# Altium footprint library mmyLibrary.PcbLib: 231 footprints (part 4 of 15)
Each footprint in its own frame and in the unit in brackets; x right, y up, seen from the top. Pads: shape width x height; smd on the part's side, far side on the other; paste and mask are expansions set on the pad; w line width, h text height; cw(c..) or ccw(c..) is an arc to the next point about the centre after c.
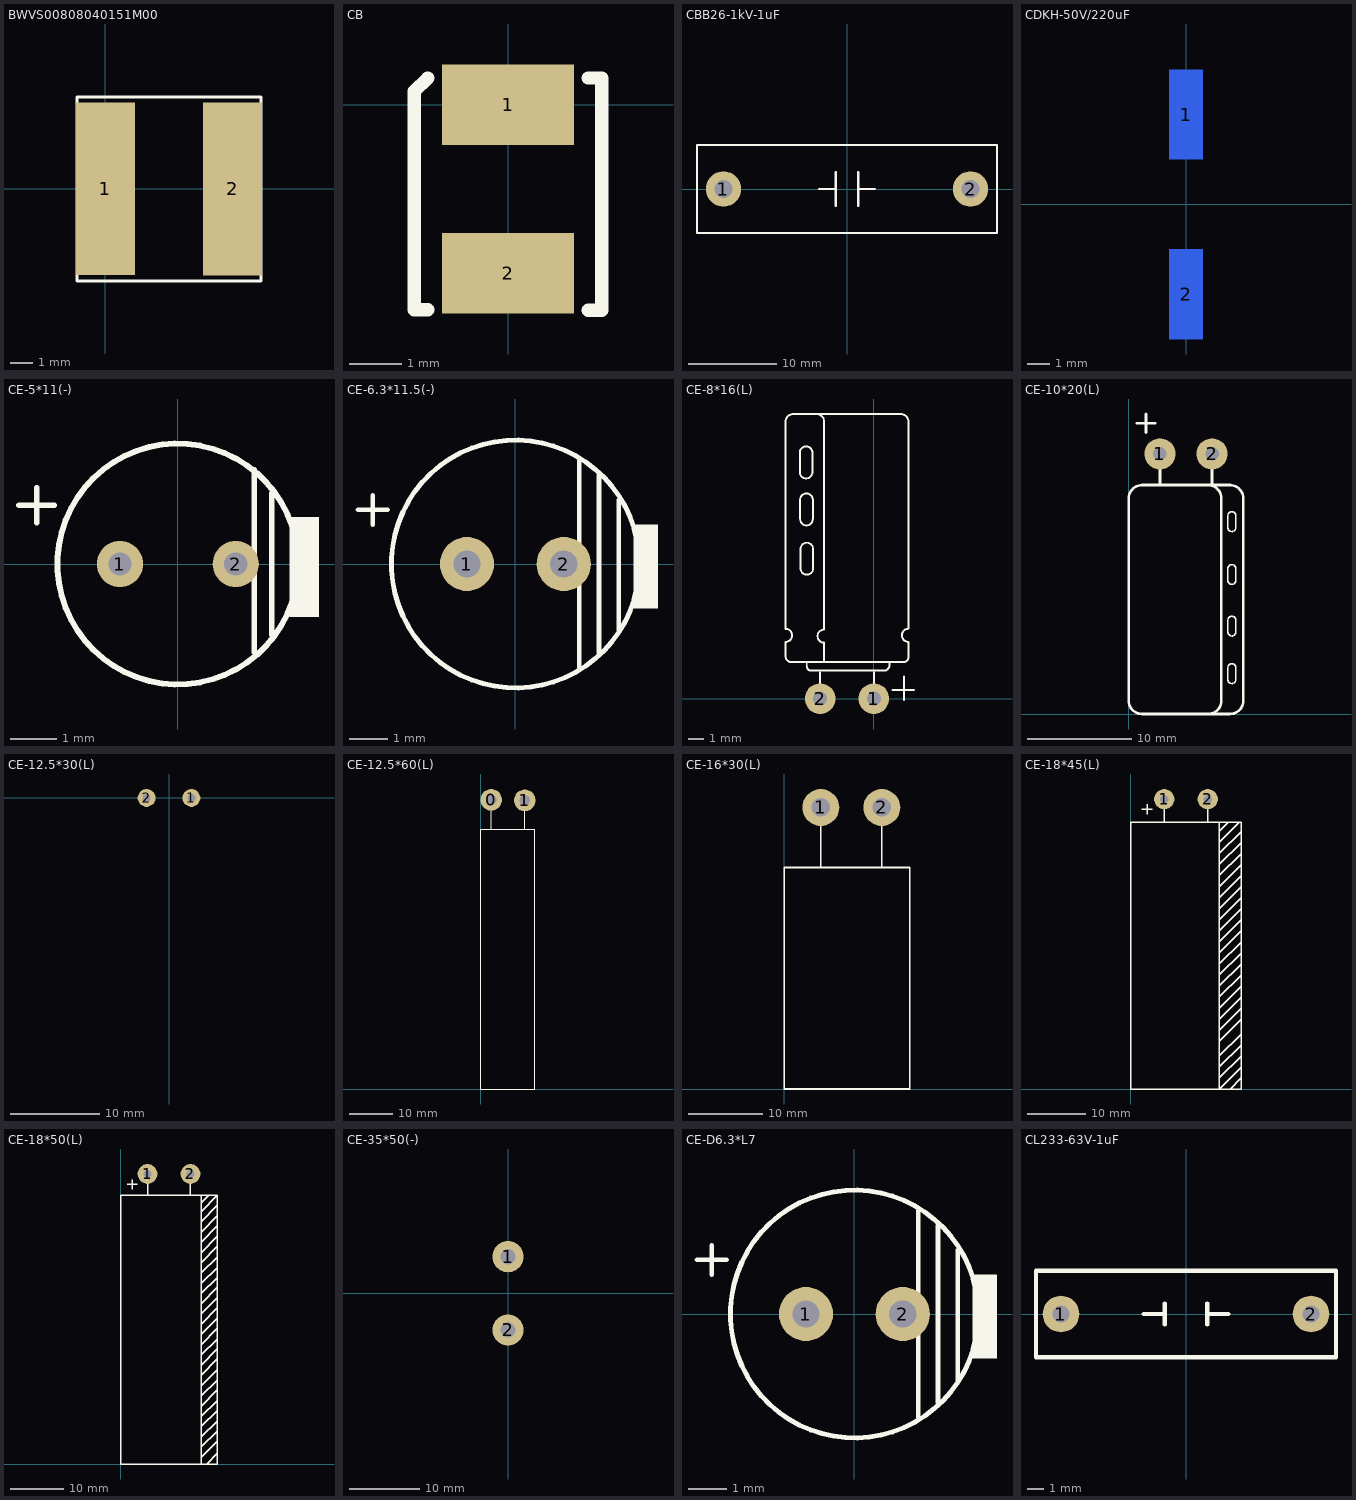
[diagram p3: the footprints below, top view; thin cyan lines are the x and y axes]

## BWVS00808040151M00 [mm] "8mm*8mm*4mm"
height 4
pads (2):
  rect 2.6x7.6 smd: 1(0,0) 2(5.608,-0.014)
Top Overlay:
  lines w0.127: -1.25,-4.064 6.85,-4.064 6.85,4.036 -1.25,4.036 -1.25,-4.064

## CB [mm]
pads (2):
  rect 2.5x1.524 smd: 1(0,0) 2(0,-3.2)
Top Overlay:
  lines w0.254: -1.524,-3.891 -1.778,-3.891 -1.778,0.254 -1.524,0.508 ; 1.524,-3.905 1.778,-3.905 1.778,0.508 1.524,0.508
3D body "User Library-TAN1206.STEP": height 1.6, standoff 0, extent -0.673,-3.124 0.927,0.076

## CBB26-1kV-1uF [mm]
pads (2):
  round 4 hole 2: 1(-14,0) 2(14,0)
Top Overlay:
  lines w0.254: -3.175,0 -1.27,0 ; -1.27,-1.905 -1.27,1.905 ; 1.27,-1.905 1.27,1.905 ; 1.27,0 3.175,0 ; -17,-5 -17,5 17,5 17,-5 -17,-5

## CDKH-50V/220uF [mm]
pads (2):
  rect 1.5x4 smd far side: 1(0,4) 2(0,-4)
Bottom Overlay:
  lines w0.127: -1,-1 1,-1 ; -1,1 1,1 ; -0.508,6.858 0.508,6.858 ; 0,6.35 0,7.366 ; 1,-2 5.5,-2 ; 1,2 5.5,2 ; 4.025,5.461 5.461,4.025 ; -5.5,4.064 -4.064,5.5 ; -5.5,4.064 -4.064,5.5 ; -5.5,4.064 -5.5,-5.5 -1,-5.5 -1,5.5 -4.064,5.5 ; 1,-5.5 1,5.5 3.986,5.5 5.5,3.986 5.5,-5.5 1,-5.5

## CE-5*11(-) [mm]
pads (2):
  round 1 hole 0.5: 1(-1.25,0) 2(1.25,0)
Top Overlay:
  circle w0.127: c0,0 r2.6
  rectangle: 2.413,-1.143 3.048,1.016
  lines w0.12: -3.429,1.27 -2.667,1.27 ; -3.048,0.889 -3.048,1.651 ; 1.651,-1.905 1.651,2.032 ; 2.032,-1.524 2.032,1.524
3D body "User Library-CAPPD5x11.STEP": height 11.47, standoff -1.26, extent -2.603,-2.642 2.603,2.54

## CE-6.3*11.5(-) [mm]
pads (2):
  round 1.4 hole 0.7: 1(-1.25,0) 2(1.25,0)
Top Overlay:
  circle w0.127: c0,0 r3.2
  rectangle: 3.048,-1.143 3.683,1.016
  lines w0.12: -4.064,1.397 -3.302,1.397 ; -3.683,1.016 -3.683,1.778 ; 1.651,-2.667 1.651,2.667 ; 2.159,-2.286 2.159,2.286 ; 2.667,-1.778 2.667,1.651
3D body "User Library-CAPAER_D063_L115_P025_W005X030.STEP": height 11.51, standoff -3, extent -3.16,-3.15 3.15,3.15

## CE-8*16(L) [mm]
pads (2):
  round 2 hole 0.9: 1(0,0) 2(-3.5,0)
Top Overlay:
  lines w0.127: -5.75,12.27 -5.75,18.034 cw(c-5.25,18.034) -5.25,18.534 -3.74,18.534 ; -5.75,12.5 -5.75,4.546 cw(c-5.75,4.118) -5.75,3.69 -5.75,2.77 ccw(c-5.36,2.77) -5.36,2.38 1.61,2.38 1.94,2.38 ccw(c1.94,2.69) 2.25,2.69 2.25,3.694 cw(c2.25,4.122) 2.25,4.55 2.25,12.5 ; -4.82,16.01 cw(c-4.409,16.01) -3.998,16.01 ; -4.82,16.029 -4.82,14.75 ccw(c-4.409,14.75) -3.998,14.75 -3.998,16.029 ; -4.8,12.95 cw(c-4.389,12.95) -3.978,12.95 ; -4.8,12.969 -4.8,11.69 ccw(c-4.389,11.69) -3.978,11.69 -3.978,12.969 ; -4.78,9.74 cw(c-4.369,9.74) -3.958,9.74 ; -4.78,9.759 -4.78,8.48 ccw(c-4.369,8.48) -3.958,8.48 -3.958,9.759 ; -4.37,2.38 -4.37,2.1 ccw(c-4.09,2.1) -4.09,1.82 -0.68,1.82 ; -3.5,0 -3.5,1.7 ; -3.5,1.82 -0.04,1.82 ; -3.24,2.39 -3.24,2.93 ; -3.24,2.82 -3.24,3.6 ; -3.24,3.642 cw(c-3.24,4.07) -3.24,4.498 -3.24,4.99 ; -3.24,4.89 -3.24,11.88 -3.24,12.24 ; -3.24,12.25 -3.24,18.034 ccw(c-3.74,18.034) -3.74,18.534 ; -3.24,17.145 -3.24,17.23 ; -0.26,1.82 0.66,1.82 ; 0,0 0,1.69 ; 0.67,1.83 ccw(c0.67,2.17) 1.01,2.17 1.01,2.39 ; 1.21,0.57 2.61,0.57 ; 1.95,-0.09 1.95,1.45 ; 2.25,12.27 2.25,17.435 ; 2.25,17.145 2.25,18.034 ccw(c1.75,18.034) 1.75,18.534 -3.74,18.534

## CE-10*20(L) [mm]
pads (2):
  round 3 hole 1.3: 1(3,25) 2(8,25)
Top Overlay:
  lines w0.127: 9.525,3.302 ccw(c9.906,3.302) 10.287,3.302 10.287,4.445 ccw(c9.906,4.445) 9.525,4.445 9.525,3.302 ; 9.525,7.874 ccw(c9.906,7.874) 10.287,7.874 10.287,9.017 ccw(c9.906,9.017) 9.525,9.017 9.525,7.874 ; 9.525,12.827 ccw(c9.906,12.827) 10.287,12.827 10.287,13.97 ccw(c9.906,13.97) 9.525,13.97 9.525,12.827 ; 9.525,17.907 ccw(c9.906,17.907) 10.287,17.907 10.287,19.05 ccw(c9.906,19.05) 9.525,19.05 9.525,17.907
  lines w0.254: 0,18.415 0,20.73 cw(c1.27,20.73) 1.27,22 9.75,22 ; 0,20.574 0,1.27 ccw(c1.27,1.27) 1.27,0 ; 0.762,27.94 2.54,27.94 ; 1.651,27.051 1.651,28.829 ; 2.794,0 1.27,0 ; 3,22 3,25 ; 6.604,22 7.62,22 cw(c7.62,20.73) 8.89,20.73 8.89,1.27 cw(c7.62,1.27) 7.62,0 ; 8,22 8,25 ; 8.509,0 9.73,0 ccw(c9.73,1.27) 11,1.27 ; 8.763,22 9.73,22 cw(c9.73,20.73) 11,20.73 ; 9.652,0 1.27,0 ; 11,1.348 11,20.75

## CE-12.5*30(L) [mm]
height 30
pads (2):
  round 2 hole 0.9: 1(2.5,0) 2(-2.5,0)
Bottom Overlay:
  lines w0.127: -6.511,-31.642 ccw(c-5.551,-31.552) -5.461,-32.512 ; -6.5,-31.8 -6.5,-5.78 ; -6.5,-5.7 cw(c-6.26,-5.75) -6.21,-5.51 ; -6.5,-2.9 cw(c-6.085,-2.915) -6.07,-2.5 ; -6.5,-2.86 -6.5,-3.62 ccw(c-6.26,-3.67) -6.31,-3.91 cw(c-6.31,-4.71) -6.31,-5.51 ; -5.99,-2.5 5.76,-2.5 ; -5.46,-32.5 5.63,-32.5 ; -4.109,-27.129 ccw(c-5.059,-27.183) -6.01,-27.174 -6.01,-30.534 ccw(c-5.06,-30.48) -4.109,-30.489 -4.109,-27.109 ; -3.99,-2.5 cw(c-3.255,-2.455) -3.3,-1.72 ; -3.979,-17.979 ccw(c-4.929,-18.033) -5.88,-18.024 -5.88,-21.384 ccw(c-4.93,-21.33) -3.979,-21.339 -3.979,-17.959 ; -3.979,-9.339 ccw(c-4.929,-9.393) -5.88,-9.384 -5.88,-12.744 ccw(c-4.93,-12.69) -3.979,-12.699 -3.979,-9.319 ; -3.336,-31.642 ccw(c-2.376,-31.552) -2.286,-32.512 ; -3.29,-1.72 3.28,-1.72 cw(c3.16,-2.38) 3.82,-2.5 ; -3.28,-31.8 -3.28,-5.77 ; -3.28,-5.69 cw(c-3.04,-5.74) -2.99,-5.5 ; -3.28,-2.49 -3.28,-3.61 ccw(c-3.04,-3.66) -3.09,-3.9 cw(c-3.09,-4.7) -3.09,-5.5 ; -2.5,-1.7 -2.5,0 ; 2.5,-1.69 2.5,0 ; 3.71,-0.57 5.11,-0.57 ; 4.45,-1.45 4.45,0.09 ; 5.588,-32.512 ccw(c5.498,-31.552) 6.458,-31.462 ; 5.65,-2.5 6.1,-2.5 cw(c6.085,-2.915) 6.5,-2.93 6.5,-3.62 cw(c6.26,-3.67) 6.31,-3.91 ccw(c6.31,-4.71) 6.31,-5.51 ; 6.21,-5.51 cw(c6.26,-5.75) 6.5,-5.7 6.5,-31.8

## CE-12.5*60(L) [mm]
pads (2):
  round 5 hole 2.5: 0(2.413,66.802) 1(10.16,66.675)
Top Overlay:
  lines w0.254: 2.413,60 2.413,66.802 ; 10.16,60 10.16,66.675 ; 0,0 12.5,0 12.5,60 0,60 0,0

## CE-16*30(L) [mm]
pads (2):
  round 5 hole 2.5: 1(4.953,38.1) 2(13.208,38.1)
Top Overlay:
  lines w0.254: 4.953,30 4.953,38.1 ; 13.208,30.127 13.208,38.1 ; 0,0 0,30 17,30 17,0 0,0

## CE-18*45(L) [mm]
pads (2):
  round 3.5 hole 1.5: 1(5.75,50) 2(13.25,50)
Top Overlay:
  lines w0.254: 1.905,48.26 3.683,48.26 ; 2.794,47.371 2.794,49.149 ; 5.75,46 5.75,50 ; 13.25,46 13.25,50 ; 15.24,1.905 19,5.665 ; 15.24,3.81 19,7.57 ; 15.24,5.715 19,9.475 ; 15.24,8.255 19,12.015 ; 15.24,10.16 19,13.92 ; 15.24,12.065 19,15.825 ; 15.24,13.97 19,17.73 ; 15.24,15.875 19,19.635 ; 15.24,17.78 19,21.54 ; 15.24,19.685 19,23.445 ; 15.24,21.59 19,25.35 ; 15.24,23.495 19,27.255 ; 15.24,25.4 19,29.16 ; 15.24,27.305 19,31.065 ; 15.24,29.21 19,32.97 ; 15.24,31.115 19,34.875 ; 15.24,33.02 19,36.78 ; 15.24,34.925 19,38.685 ; 15.24,36.83 19,40.59 ; 15.24,38.735 19,42.495 ; 15.24,40.64 19,44.4 ; 15.24,42.545 18.695,46 ; 15.24,44.45 16.764,45.974 ; 15.24,46 15.24,0 19,3.76 ; 17.145,0 18.962,1.817 ; 0,0 19,0 19,46 0,46 0,0

## CE-18*50(L) [mm]
pads (2):
  round 3.7 hole 1.5: 1(5,54) 2(13,54)
Top Overlay:
  lines w0.254: 1.27,52.07 3.048,52.07 ; 2.159,51.181 2.159,52.959 ; 5,50 5,55 ; 13,50 13,55 ; 15,0 15,50 ; 15,1.27 18,4.191 ; 15,3.175 18,6.096 ; 15,5.08 18,8.001 ; 15,6.985 18,9.906 ; 15,8.89 18,11.811 ; 15,10.795 18,13.843 ; 15,12.7 18,15.621 ; 15,14.605 18,17.526 ; 15,16.51 18,19.558 ; 15,18.415 18,21.463 ; 15,20.32 18,23.241 ; 15,22.225 18,25.273 ; 15,24.13 18,27.178 ; 15,26.035 18,29.083 ; 15,27.94 18,30.988 ; 15,29.845 18,32.893 ; 15,31.75 18,34.671 ; 15,33.655 18,36.576 ; 15,35.56 18,38.481 ; 15,37.465 18,40.513 ; 15,39.37 18,42.418 ; 15,41.275 18,44.323 ; 15,43.18 18,46.228 ; 15,45.085 18,48.133 ; 15,46.99 18,50 ; 15,48.641 16.383,50 ; 16.002,0 18,2.032 ; 18,50 18,0 0,0 0,50 18,50

## CE-35*50(-) [mm] "H30P10.5D2.2"
pads (2):
  round 4.5 hole 2.2: 1(0,5.25) 2(0,-5.25)
Bottom Overlay:
  circle w0.254: c0,0 r18.5
  circle w0.254: c2.83,-2.83 r2
  circle w0.254: c-2.83,2.83 r2
  region: -6.177,-17.458 -6.177,-19.258 5.953,-19.258 5.953,-17.458
  lines w0.254: -17.92,-1.47 -1.86,-1.47 ; -16.63,-5.06 -2.86,-5.06 ; -15.62,-8.67 15.69,-8.67 ; -13.12,-12.16 13.17,-12.16 ; -11.75,17.13 -8.9,17.13 ; -10.36,15.76 -10.36,18.47 ; -8.39,-15.79 8.49,-15.79 ; -6.177,-17.438 -6.177,-19.188 -6.137,-19.228 5.973,-19.228 5.973,-17.418 5.953,-17.398 ; -6.071,-17.399 5.969,-17.399 ; 2.845,-4.296 2.845,-1.325 ; 4.84,-5.06 16.99,-5.06 ; 5.46,-1.47 17.9,-1.47
  text "+" at -1.041,4.102 h3.81

## CE-D6.3*L7 [mm] "华威"
pads (2):
  round 1.4 hole 0.7: 1(-1.25,0) 2(1.25,0)
Top Overlay:
  circle w0.127: c0,0 r3.2
  rectangle: 3.048,-1.143 3.683,1.016
  lines w0.12: -4.064,1.397 -3.302,1.397 ; -3.683,1.016 -3.683,1.778 ; 1.651,-2.667 1.651,2.667 ; 2.159,-2.286 2.159,2.286 ; 2.667,-1.778 2.667,1.651

## CL233-63V-1uF [mm]
pads (2):
  round 2.2 hole 1: 1(-7.5,0) 2(7.5,0)
Top Overlay:
  lines w0.254: -2.54,0 -1.27,0 ; -1.27,-0.635 -1.27,0.635 ; 1.27,-0.635 1.27,0.635 ; 1.27,0 2.54,0 ; -9,-2.6 -9,2.6 9,2.6 9,-2.6 -9,-2.6